# Altium footprint library UWRT_Footprint_Library_2020.PcbLib: 376 footprints (part 6 of 24)
Each footprint in its own frame and in the unit in brackets; x right, y up, seen from the top. Pads: shape width x height; smd on the part's side, far side on the other; paste and mask are expansions set on the pad; w line width, h text height; cw(c..) or ccw(c..) is an arc to the next point about the centre after c.
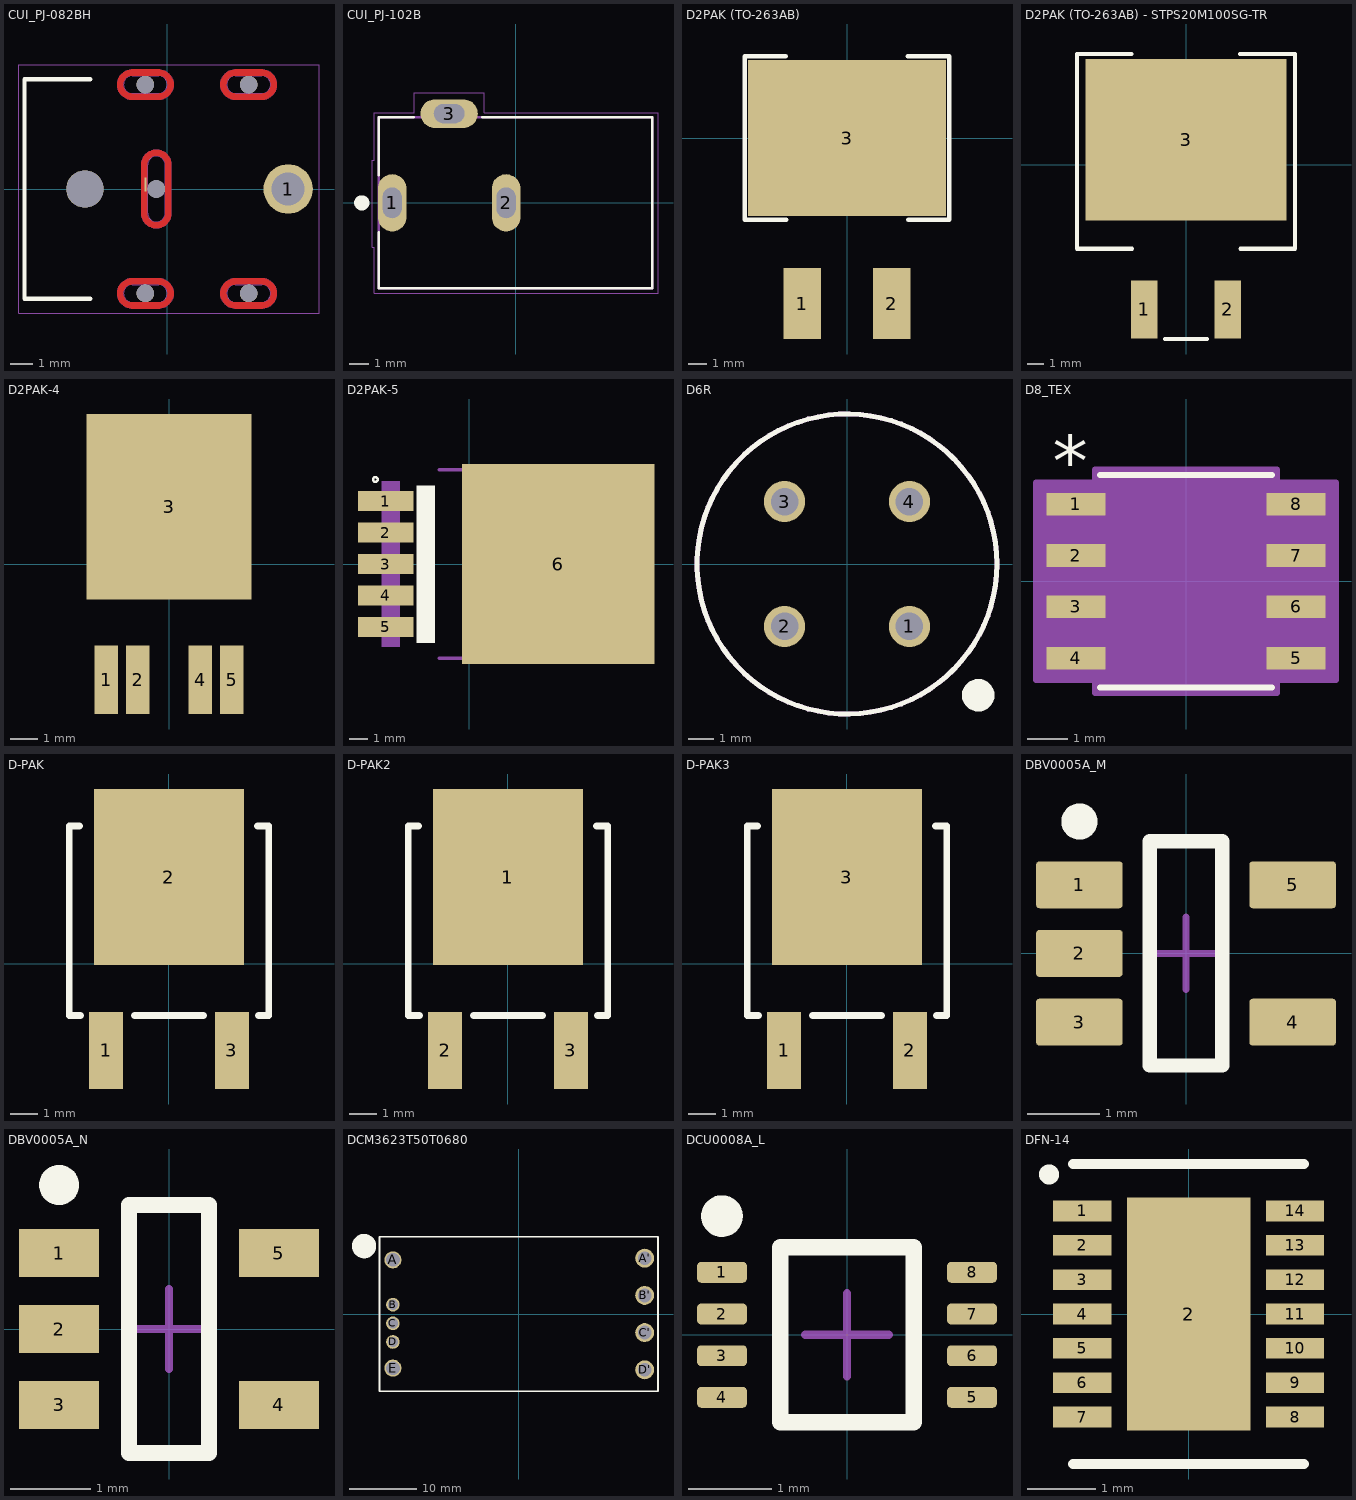
[diagram p5: the footprints below, top view; thin cyan lines are the x and y axes]

## CUI_PJ-082BH [mm]
pads (8):
  round 2.25 hole 1.5: 1(5.5,0)
  rect 0.1x0.635 smd: 2(-1,0.2)
  round 1.7 hole 1.7 unplated: ""(-3.75,0)
  round 0.8 hole 0.8 unplated: ""(-1,-4.75) ""(-1,4.75) ""(-0.5,0) ""(3.7,-4.75) ""(3.7,4.75)
Top Layer:
  lines w0.3: -2.15,-4.75 ccw(c-1.6,-4.75) -1.6,-5.3 -0.4,-5.3 ccw(c-0.4,-4.75) 0.15,-4.75 ccw(c-0.4,-4.75) -0.4,-4.2 -1.6,-4.2 ccw(c-1.6,-4.75) -2.15,-4.75 ; -2.15,4.75 ccw(c-1.6,4.75) -1.6,4.2 -0.4,4.2 ccw(c-0.4,4.75) 0.15,4.75 ccw(c-0.4,4.75) -0.4,5.3 -1.6,5.3 ccw(c-1.6,4.75) -2.15,4.75 ; -1.05,-1.1 ccw(c-0.5,-1.1) -0.5,-1.65 ccw(c-0.5,-1.1) 0.05,-1.1 0.05,1.1 ccw(c-0.5,1.1) -0.5,1.65 ccw(c-0.5,1.1) -1.05,1.1 -1.05,-1.1 ; 2.55,-4.75 ccw(c3.1,-4.75) 3.1,-5.3 4.3,-5.3 ccw(c4.3,-4.75) 4.85,-4.75 ccw(c4.3,-4.75) 4.3,-4.2 3.1,-4.2 ccw(c3.1,-4.75) 2.55,-4.75 ; 2.55,4.75 ccw(c3.1,4.75) 3.1,4.2 4.3,4.2 ccw(c4.3,4.75) 4.85,4.75 ccw(c4.3,4.75) 4.3,5.3 3.1,5.3 ccw(c3.1,4.75) 2.55,4.75
Bottom Layer:
  lines w0.3: -2.15,-4.75 ccw(c-1.6,-4.75) -1.6,-5.3 -0.4,-5.3 ccw(c-0.4,-4.75) 0.15,-4.75 ccw(c-0.4,-4.75) -0.4,-4.2 -1.6,-4.2 ccw(c-1.6,-4.75) -2.15,-4.75 ; -2.15,4.75 ccw(c-1.6,4.75) -1.6,4.2 -0.4,4.2 ccw(c-0.4,4.75) 0.15,4.75 ccw(c-0.4,4.75) -0.4,5.3 -1.6,5.3 ccw(c-1.6,4.75) -2.15,4.75 ; -1.05,-1.1 ccw(c-0.5,-1.1) -0.5,-1.65 ccw(c-0.5,-1.1) 0.05,-1.1 0.05,1.1 ccw(c-0.5,1.1) -0.5,1.65 ccw(c-0.5,1.1) -1.05,1.1 -1.05,-1.1 ; 2.55,-4.75 ccw(c3.1,-4.75) 3.1,-5.3 4.3,-5.3 ccw(c4.3,-4.75) 4.85,-4.75 ccw(c4.3,-4.75) 4.3,-4.2 3.1,-4.2 ccw(c3.1,-4.75) 2.55,-4.75 ; 2.55,4.75 ccw(c3.1,4.75) 3.1,4.2 4.3,4.2 ccw(c4.3,4.75) 4.85,4.75 ccw(c4.3,4.75) 4.3,5.3 3.1,5.3 ccw(c3.1,4.75) 2.55,4.75
Top Overlay:
  lines w0.2: -3.5,-5 -6.5,-5 -6.5,5 -3.5,5
Top Paste:
  lines w0.3: -2.15,-4.75 ccw(c-1.6,-4.75) -1.6,-5.3 -0.4,-5.3 ccw(c-0.4,-4.75) 0.15,-4.75 ccw(c-0.4,-4.75) -0.4,-4.2 -1.6,-4.2 ccw(c-1.6,-4.75) -2.15,-4.75 ; -2.15,4.75 ccw(c-1.6,4.75) -1.6,4.2 -0.4,4.2 ccw(c-0.4,4.75) 0.15,4.75 ccw(c-0.4,4.75) -0.4,5.3 -1.6,5.3 ccw(c-1.6,4.75) -2.15,4.75 ; -1.05,-1.1 ccw(c-0.5,-1.1) -0.5,-1.65 ccw(c-0.5,-1.1) 0.05,-1.1 0.05,1.1 ccw(c-0.5,1.1) -0.5,1.65 ccw(c-0.5,1.1) -1.05,1.1 -1.05,-1.1 ; 2.55,-4.75 ccw(c3.1,-4.75) 3.1,-5.3 4.3,-5.3 ccw(c4.3,-4.75) 4.85,-4.75 ccw(c4.3,-4.75) 4.3,-4.2 3.1,-4.2 ccw(c3.1,-4.75) 2.55,-4.75 ; 2.55,4.75 ccw(c3.1,4.75) 3.1,4.2 4.3,4.2 ccw(c4.3,4.75) 4.85,4.75 ccw(c4.3,4.75) 4.3,5.3 3.1,5.3 ccw(c3.1,4.75) 2.55,4.75
Bottom Paste:
  lines w0.3: -2.15,-4.75 ccw(c-1.6,-4.75) -1.6,-5.3 -0.4,-5.3 ccw(c-0.4,-4.75) 0.15,-4.75 ccw(c-0.4,-4.75) -0.4,-4.2 -1.6,-4.2 ccw(c-1.6,-4.75) -2.15,-4.75 ; -2.15,4.75 ccw(c-1.6,4.75) -1.6,4.2 -0.4,4.2 ccw(c-0.4,4.75) 0.15,4.75 ccw(c-0.4,4.75) -0.4,5.3 -1.6,5.3 ccw(c-1.6,4.75) -2.15,4.75 ; -1.05,-1.1 ccw(c-0.5,-1.1) -0.5,-1.65 ccw(c-0.5,-1.1) 0.05,-1.1 0.05,1.1 ccw(c-0.5,1.1) -0.5,1.65 ccw(c-0.5,1.1) -1.05,1.1 -1.05,-1.1 ; 2.55,-4.75 ccw(c3.1,-4.75) 3.1,-5.3 4.3,-5.3 ccw(c4.3,-4.75) 4.85,-4.75 ccw(c4.3,-4.75) 4.3,-4.2 3.1,-4.2 ccw(c3.1,-4.75) 2.55,-4.75 ; 2.55,4.75 ccw(c3.1,4.75) 3.1,4.2 4.3,4.2 ccw(c4.3,4.75) 4.85,4.75 ccw(c4.3,4.75) 4.3,5.3 3.1,5.3 ccw(c3.1,4.75) 2.55,4.75
Top Solder:
  drawing of 5 lines, arcs and shapes, not listed
Bottom Solder:
  drawing of 5 lines, arcs and shapes, not listed
Mechanical 1:
  lines w0.001: -2,-4.75 ccw(c-1.6,-4.75) -1.6,-5.15 -0.4,-5.15 ccw(c-0.4,-4.75) 0,-4.75 ccw(c-0.4,-4.75) -0.4,-4.35 -1.6,-4.35 ccw(c-1.6,-4.75) -2,-4.75 ; -2,4.75 ccw(c-1.6,4.75) -1.6,4.35 -0.4,4.35 ccw(c-0.4,4.75) 0,4.75 ccw(c-0.4,4.75) -0.4,5.15 -1.6,5.15 ccw(c-1.6,4.75) -2,4.75 ; -0.9,-1.1 ccw(c-0.5,-1.1) -0.5,-1.5 ccw(c-0.5,-1.1) -0.1,-1.1 -0.1,1.1 ccw(c-0.5,1.1) -0.5,1.5 ccw(c-0.5,1.1) -0.9,1.1 -0.9,-1.1 ; 2.7,-4.75 ccw(c3.1,-4.75) 3.1,-5.15 4.3,-5.15 ccw(c4.3,-4.75) 4.7,-4.75 ccw(c4.3,-4.75) 4.3,-4.35 3.1,-4.35 ccw(c3.1,-4.75) 2.7,-4.75 ; 2.7,4.75 ccw(c3.1,4.75) 3.1,4.35 4.3,4.35 ccw(c4.3,4.75) 4.7,4.75 ccw(c4.3,4.75) 4.3,5.15 3.1,5.15 ccw(c3.1,4.75) 2.7,4.75
Mechanical 15:
  lines w0.05: -6.75,-5.65 6.9,-5.65 6.9,5.65 -6.75,5.65 -6.75,-5.65
3D body "CUI_DEVICES_PJ-082BH.step": height 10.15, standoff -2.05, extent -6.522,-5.125 6.608,5.075

## CUI_PJ-102B [mm]
pads (3):
  oval 1.508x3.016 hole 1 slot 1.6 at 90 deg: 1(-6.5,0) 2(-0.5,0)
  oval 3.016x1.508 hole 1 slot 1.6 at 0 deg: 3(-3.5,4.7)
Top Overlay:
  circle w0.4: c-8.1,0 r0.2
  lines w0.127: -7.2,-1.55 -7.2,-4.5 7.2,-4.5 7.2,4.5 -1.75,4.5 ; -7.2,1.45 -7.2,4.5 -5.35,4.5
Mechanical 13:
  lines w0.127: -7.2,-4.5 -7.2,4.5 7.2,4.5 7.2,-4.5 -7.2,-4.5
Mechanical 15:
  lines w0.05: -7.55,-2.35 -7.45,-2.35 -7.45,-4.75 7.5,-4.75 7.5,4.75 -1.65,4.75 -1.65,5.8 -5.35,5.8 -5.35,4.75 -7.45,4.75 -7.45,2.25 -7.55,2.25 -7.55,-2.35
3D body "CUI_DEVICES_PJ-102B.step": height 11.5, standoff -3, extent -7.2,-4.5 7.2,4.9

## D2PAK (TO-263AB) [mm] "TO-252AA"
pads (3):
  rect 2.032x3.81 smd: 1(-2.41,-8.905) 2(2.41,-8.905)
  rect 10.66x8.38 smd: 3(0,0)
Top Overlay:
  lines w0.254: -3.302,4.4 -5.5,4.4 -5.5,-4.399 -3.27,-4.399 ; -1.27,-1.905 1.27,-1.905 ; 3.27,4.4 5.5,4.4 5.5,-4.4 3.302,-4.4
3D body "TO-263.step": height 4.4, standoff 0, extent -5.1,-9.6 5.1,6.1

## D2PAK (TO-263AB) - STPS20M100SG-TR [mm] "TO-252AA"
pads (3):
  rect 1.6x3.5 smd: 1(-2.54,-8.751) 2(2.54,-8.751)
  rect 12.2x9.75 smd: 3(0,1.524)
Top Overlay:
  lines w0.254: -3.302,6.711 -6.604,6.711 -6.604,-5.08 -3.27,-5.08 ; -1.27,-10.541 1.27,-10.541 ; 3.27,6.711 6.604,6.711 6.604,-5.08 3.302,-5.08
3D body "STPS20M100SG-TR.stp": height 4.6, standoff 0, extent -5.1,-9.744 5.1,5.68

## D2PAK-4 [mm]
pads (5):
  rect 0.85x2.5 smd: 1(-2.28,-4.2) 2(-1.14,-4.2) 4(1.14,-4.2) 5(2.28,-4.2)
  rect 6x6.75 smd: 3(0,2.1)
3D body "TO252-5.STEP": height 2.3, standoff 0, extent -3.25,-4.7 3.25,5.2

## D2PAK-5 [mil]
pads (6):
  rect 118.11x42 smd: 1(-178,134) 2(-178,67) 3(-178,0) 4(-178,-67) 5(-178,-134)
  rect 409.84x425.2 smd: 6(189.37,0)
Top Overlay:
  circle w5: c-200,180 r5
  region: -74,101.16 -112.18,101.16 -112.18,167 -74,167
  region: -74,34.01 -112.02,34.01 -112.02,100 -74,100
  region: -74,-33 -112.02,-33 -112.02,33 -74,33
  region: -74,-100.05 -112.05,-100.05 -112.05,-34 -74,-34
  region: -74,-167.25 -112.16,-167.25 -112.16,-101 -74,-101
Mechanical 13:
  region: -148.5,91.55 -186.61,91.55 -186.61,176.5 -148.5,176.5
  region: -148.5,24.54 -186.82,24.54 -186.82,109.5 -148.5,109.5
  region: -148.5,-42.53 -186.63,-42.53 -186.63,42.5 -148.5,42.5
  region: -148.5,-109.6 -186.68,-109.6 -186.68,-24.5 -148.5,-24.5
  region: -148.5,-176.75 -186.76,-176.75 -186.76,-91.5 -148.5,-91.5
  region: 370.29,133 370.29,-133 352.29,-201 336.1,-201 336.1,201 352.29,201
  lines w8: -63.39,-200.55 332.09,-200.55 332.09,200.55 -63.39,200.55 ; 336.1,-200.98 352.28,-200.98 370.28,-132.99 370.28,132.99 352.28,200.98 336.1,200.98 336.1,-200.98
3D body "TO170P1524X482-6N_JEDEC_TO-263BA.STEP": height 175, standoff 0, extent -220.53,-199.99 426,200.01

## D6R [mm]
pads (4):
  round 1.64 hole 1.1: 1(2.5,-2.5) 2(-2.5,-2.5) 3(-2.5,2.5) 4(2.5,2.5)
Top Overlay:
  circle w0.2: c0,0 r6
  circle w0.7: c5.25,-5.25 r0.3
Mechanical 13:
  circle w0.2: c0,0 r6
3D body "User Library-D6R.STEP": height 12.8, standoff -4.5, extent -5.4,-6 6,6

## D8_TEX [mil]
pads (8):
  rect 57.5x22 smd paste+0 mask+0: 1(-107.25,75) 2(-107.25,25) 3(-107.25,-25) 4(-107.25,-75) 5(107.25,-75) 6(107.25,-25) 7(107.25,25) 8(107.25,75)
Top Overlay:
  lines w6: -83.5,-103.5 83.5,-103.5 ; -83.5,103.5 83.5,103.5
  text "*" at -129.75,92 h50
Mechanical 13:
  lines w0: -12,98.5 ccw(c0,98.5) 12,98.5
  lines w1: -122,-85 -122,-65 -78.5,-65 -78.5,-85 -122,-85 ; -122,-35 -122,-15 -78.5,-15 -78.5,-35 -122,-35 ; -122,15 -122,35 -78.5,35 -78.5,15 -122,15 ; -122,65 -122,85 -78.5,85 -78.5,65 -122,65 ; -78.5,-98.5 78.5,-98.5 78.5,98.5 -78.5,98.5 -78.5,-98.5 ; 78.5,-85 78.5,-65 122,-65 122,-85 78.5,-85 ; 78.5,-35 78.5,-15 122,-15 122,-35 78.5,-35 ; 78.5,15 78.5,35 122,35 122,15 78.5,15 ; 78.5,65 78.5,85 122,85 122,65 78.5,65
  text "*" at -76,45.5 h50
Mechanical 15:
  region: -88.5,-96 -146,-96 -146,96 -88.5,96 -88.5,108.5 88.5,108.5 88.5,96 146,96 146,-96 88.5,-96 88.5,-108.5 -88.5,-108.5
  lines w6: -146,-96 -146,96 -88.5,96 -88.5,108.5 88.5,108.5 88.5,96 146,96 146,-96 88.5,-96 88.5,-108.5 -88.5,-108.5 -88.5,-96 -146,-96
3D body "D8_TEX.step": height 69.09, standoff 0, extent -122.01,-98.5 122.01,98.5

## D-PAK [mm] "TO-252AA"
pads (3):
  rect 1.25x2.85 smd: 1(-2.325,-3.2) 3(2.325,-3.2)
  rect 5.55x6.5 smd: 2(0,3.2)
Top Overlay:
  lines w0.254: -3.302,5.08 -3.683,5.08 -3.683,-1.905 -3.27,-1.905 ; -1.27,-1.905 1.27,-1.905 ; 3.27,5.08 3.683,5.08 3.683,-1.905 3.302,-1.905
3D body "FERD20H100SB-TR--3DModel-STEP-56544.STEP": height 2.64, standoff 0.01, extent -3.27,-4.08 3.27,5.795

## D-PAK2 [mm] "TO-252AA"
pads (3):
  rect 5.55x6.5 smd: 1(0,3.2)
  rect 1.25x2.85 smd: 2(-2.325,-3.2) 3(2.325,-3.2)
Top Overlay:
  lines w0.254: -3.302,5.08 -3.683,5.08 -3.683,-1.905 -3.27,-1.905 ; -1.27,-1.905 1.27,-1.905 ; 3.27,5.08 3.683,5.08 3.683,-1.905 3.302,-1.905
3D body "FERD20H100SB-TR--3DModel-STEP-56544.STEP": height 2.64, standoff 0.01, extent -3.27,-4.08 3.27,5.795

## D-PAK3 [mm]
pads (3):
  rect 1.25x2.85 smd: 1(-2.325,-3.2) 2(2.325,-3.2)
  rect 5.55x6.5 smd: 3(0,3.2)
Top Overlay:
  lines w0.254: -3.302,5.08 -3.683,5.08 -3.683,-1.905 -3.27,-1.905 ; -1.27,-1.905 1.27,-1.905 ; 3.27,5.08 3.683,5.08 3.683,-1.905 3.302,-1.905
3D body "FERD20H100SB-TR--3DModel-STEP-56544.STEP": height 2.64, standoff 0.01, extent -3.27,-4.08 3.27,5.795

## DBV0005A_M [mm] "SOT23, 5-Leads, Body 3.05x1.75mm, Pitch 0.95mm, IPC Low Density"
height 1.45
pads (5):
  rrect15% 1.2x0.65 smd: 1(-1.475,0.95) 2(-1.475,0) 3(-1.475,-0.95) 4(1.475,-0.95) 5(1.475,0.95)
Top Overlay:
  circle w0.25: c-1.475,1.825 r0.125
  lines w0.2: -0.5,-1.55 -0.5,1.55 0.5,1.55 0.5,-1.55 -0.5,-1.55
Mechanical 15:
  lines w0.1: -0.5,0 0.5,0 ; 0,-0.5 0,0.5
3D body "DBV0005AaksMF05A.stp": height 1.08, standoff -0.01, extent -1.422,-1.461 1.422,1.46

## DBV0005A_N [mm] "SOT23, 5-Leads, Body 3.05x1.75mm, Pitch 0.95mm, IPC Medium Density"
height 1.45
pads (5):
  rect 1x0.6 smd: 1(-1.375,0.95) 2(-1.375,0) 3(-1.375,-0.95) 4(1.375,-0.95) 5(1.375,0.95)
Top Overlay:
  circle w0.25: c-1.375,1.8 r0.125
  lines w0.2: -0.5,-1.55 0.5,-1.55 0.5,1.55 -0.5,1.55 -0.5,-1.55
Mechanical 15:
  lines w0.1: -0.5,0 0.5,0 ; 0,-0.5 0,0.5
3D body "DBV0005AaksMF05A.stp": height 1.08, standoff -0.01, extent -1.422,-1.461 1.422,1.46

## DCM3623T50T0680 [mm] "DC to DC Converter"
height 7.21
pads (9):
  round 2.53 hole 2.03: A(-18.6,8) E(-18.6,-8)
  round 2.79 hole 2.03: A'(18.6,8.25) B'(18.6,2.75) C'(18.6,-2.75) D'(18.6,-8.25)
  round 2.02 hole 1.52: B(-18.6,1.38) C(-18.6,-1.38) D(-18.6,-4.13)
Top Overlay:
  circle w1.8: c-22.86,10.033 r0.898
  lines w0.254: -20.574,-11.4 -20.574,11.4 20.574,11.4 20.574,-11.4 -20.574,-11.4
3D body "3623_dcm_thruhole_no_board.STEP": height 7.28, standoff -4.15, extent -19.541,-11.395 19.176,11.405

## DCU0008A_L [mm] "SOP, 8-Leads, Body 2.4x2.1mm, Pitch 0.5mm, IPC High Density"
height 0.9
pads (8):
  rrect40% 0.6x0.25 smd: 1(-1.5,0.75) 2(-1.5,0.25) 3(-1.5,-0.25) 4(-1.5,-0.75) 5(1.5,-0.75) 6(1.5,-0.25) 7(1.5,0.25) 8(1.5,0.75)
Top Overlay:
  circle w0.25: c-1.5,1.425 r0.125
  lines w0.2: -0.8,-1.05 0.8,-1.05 0.8,1.05 -0.8,1.05 -0.8,-1.05
Mechanical 15:
  lines w0.1: -0.5,0 0.5,0 ; 0,-0.5 0,0.5
3D body "DCU0008A.stp": height 0.9, standoff 0, extent -1.561,-1 1.561,1

## DFN-14 [mm]
pads (15):
  rect 0.85x0.3 smd: 1(-1.55,1.5) 2(-1.55,1) 3(-1.55,0.5) 4(-1.55,0) 5(-1.55,-0.5) 6(-1.55,-1) 7(-1.55,-1.5) 8(1.55,-1.5) 9(1.55,-1) 10(1.55,-0.5) 11(1.55,0) 12(1.55,0.5) 13(1.55,1) 14(1.55,1.5)
  rect 1.8x3.4 smd: 2(0,0)
Top Overlay:
  circle w0.254: c-2.032,2.032 r0.018
  lines w0.152: -1.676,-2.184 1.676,-2.184 ; -1.676,2.184 1.676,2.184
Top Paste:
  region: -0.8,1.6 -0.8,0.1 0.8,0.1 0.8,1.6
  region: -0.8,-0.1 -0.8,-1.6 0.8,-1.6 0.8,-0.1
3D body "User Library-My-DFN-14-4x3-0_5.STEP": height 0.8, standoff 0, extent -1.56,-2.05 1.56,2.05